# Altium footprint library PCB_CONNECTORS.PcbLib: 676 footprints (part 18 of 43)
Each footprint in its own frame and in the unit in brackets; x right, y up, seen from the top. Pads: shape width x height; smd on the part's side, far side on the other; paste and mask are expansions set on the pad; w line width, h text height; cw(c..) or ccw(c..) is an arc to the next point about the centre after c.
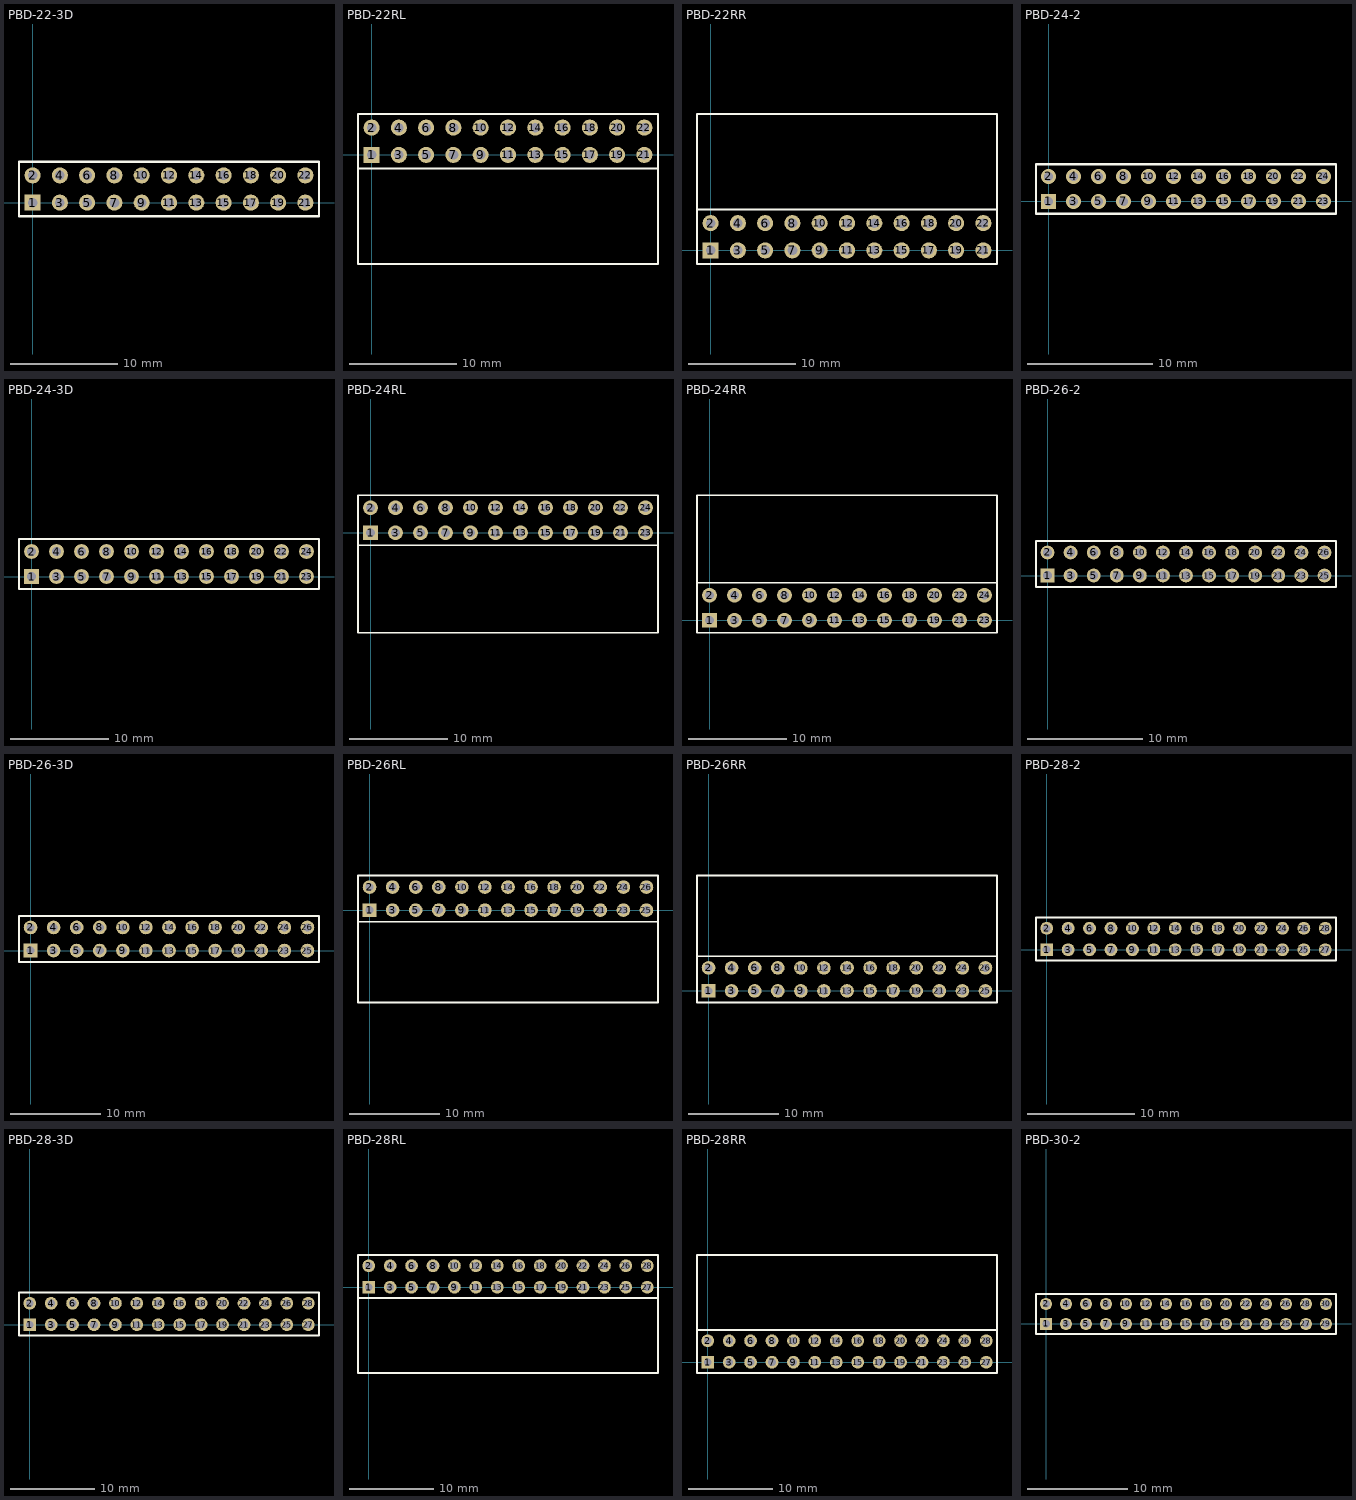
[diagram p17: the footprints below, top view; thin cyan lines are the x and y axes]

## PBD-22-3D [mm] "Connector; Header; 11x2 Position"
height 8
pads (22):
  rect 1.5x1.5 hole 0.9: 1(0,0)
  round 1.5 hole 0.9: 2(0,2.54) 3(2.54,0) 4(2.54,2.54) 5(5.08,0) 6(5.08,2.54) 7(7.62,0) 8(7.62,2.54) 9(10.16,0) 10(10.16,2.54) 11(12.7,0) 12(12.7,2.54) 13(15.24,0) 14(15.24,2.54) 15(17.78,0) 16(17.78,2.54) 17(20.32,0) 18(20.32,2.54) 19(22.86,0) 20(22.86,2.54) 21(25.4,0) 22(25.4,2.54)
Top Overlay:
  lines w0.2: -1.27,-1.27 -1.27,3.81 26.67,3.81 26.67,-1.27 -1.27,-1.27
3D body "PBD-2.stp": height 8.5, standoff -3.15, extent 16.51,-1.27 19.05,3.81
3D body "PBD-2.stp": height 8.5, standoff -3.15, extent 13.97,-1.27 16.51,3.81
3D body "PBD-2.stp": height 8.5, standoff -3.15, extent 19.05,-1.27 21.59,3.81
3D body "PBD-2.stp": height 8.5, standoff -3.15, extent 8.89,-1.27 11.43,3.81
3D body "PBD-2.stp": height 8.5, standoff -3.15, extent 6.35,-1.27 8.89,3.81
3D body "PBD-2.stp": height 8.5, standoff -3.15, extent 11.43,-1.27 13.97,3.81
3D body "PBD-2.stp": height 8.5, standoff -3.15, extent 1.27,-1.27 3.81,3.81
3D body "PBD-2.stp": height 8.5, standoff -3.15, extent -1.27,-1.27 1.27,3.81
3D body "PBD-2.stp": height 8.5, standoff -3.15, extent 3.81,-1.27 6.35,3.81
3D body "PBD-2.stp": height 8.5, standoff -3.15, extent 21.59,-1.27 24.13,3.81
3D body "PBD-2.stp": height 8.5, standoff -3.15, extent 24.13,-1.27 26.67,3.81

## PBD-22RL [mm] "Connector; Header; 11x2 Position"
height 5
pads (22):
  rect 1.5x1.5 hole 0.9: 1(0,0)
  round 1.5 hole 0.9: 2(0,2.54) 3(2.54,0) 4(2.54,2.54) 5(5.08,0) 6(5.08,2.54) 7(7.62,0) 8(7.62,2.54) 9(10.16,0) 10(10.16,2.54) 11(12.7,0) 12(12.7,2.54) 13(15.24,0) 14(15.24,2.54) 15(17.78,0) 16(17.78,2.54) 17(20.32,0) 18(20.32,2.54) 19(22.86,0) 20(22.86,2.54) 21(25.4,0) 22(25.4,2.54)
Top Overlay:
  lines w0.2: -1.27,-1.27 -1.27,-10.16 26.67,-10.16 26.67,-1.27 ; -1.27,-1.27 26.67,-1.27 ; -1.27,-1.27 -1.27,3.81 26.67,3.81 26.67,-1.27
3D body "PBD-22R.step": height 5, standoff -3, extent -1.27,-10.16 26.67,2.84

## PBD-22RR [mm] "Connector; Header; 11x2 Position"
height 5
pads (22):
  rect 1.5x1.5 hole 0.9: 1(0,0)
  round 1.5 hole 0.9: 2(0,2.54) 3(2.54,0) 4(2.54,2.54) 5(5.08,0) 6(5.08,2.54) 7(7.62,0) 8(7.62,2.54) 9(10.16,0) 10(10.16,2.54) 11(12.7,0) 12(12.7,2.54) 13(15.24,0) 14(15.24,2.54) 15(17.78,0) 16(17.78,2.54) 17(20.32,0) 18(20.32,2.54) 19(22.86,0) 20(22.86,2.54) 21(25.4,0) 22(25.4,2.54)
Top Overlay:
  lines w0.2: -1.27,3.81 -1.27,12.7 26.67,12.7 26.67,3.81 ; -1.27,3.81 26.67,3.81 ; -1.27,3.81 -1.27,-1.27 26.67,-1.27 26.67,3.81
3D body "PBD-22R.step": height 5, standoff -3, extent -1.27,-0.3 26.67,12.7

## PBD-24-2 [mm] "Connector; Header; 12x2 Position"
height 4.5
pads (24):
  rect 1.2x1.2 hole 0.75: 1(0,0)
  round 1.2 hole 0.75: 2(0,2) 3(2,0) 4(2,2) 5(4,0) 6(4,2) 7(6,0) 8(6,2) 9(8,0) 10(8,2) 11(10,0) 12(10,2) 13(12,0) 14(12,2) 15(14,0) 16(14,2) 17(16,0) 18(16,2) 19(18,0) 20(18,2) 21(20,0) 22(20,2) 23(22,0) 24(22,2)
Top Overlay:
  lines w0.2: -1,-1 23,-1 23,3 -1,3 -1,-1
3D body "PBD2mm.stp": height 4.5, standoff -2.7, extent 21,-1 23,3
3D body "PBD2mm.stp": height 4.5, standoff -2.7, extent 19,-1 21,3
3D body "PBD2mm.stp": height 4.5, standoff -2.7, extent 17,-1 19,3
3D body "PBD2mm.stp": height 4.5, standoff -2.7, extent 15,-1 17,3
3D body "PBD2mm.stp": height 4.5, standoff -2.7, extent 13,-1 15,3
3D body "PBD2mm.stp": height 4.5, standoff -2.7, extent 11,-1 13,3
3D body "PBD2mm.stp": height 4.5, standoff -2.7, extent 9,-1 11,3
3D body "PBD2mm.stp": height 4.5, standoff -2.7, extent 7,-1 9,3
3D body "PBD2mm.stp": height 4.5, standoff -2.7, extent 5,-1 7,3
3D body "PBD2mm.stp": height 4.5, standoff -2.7, extent 3,-1 5,3
3D body "PBD2mm.stp": height 4.5, standoff -2.7, extent 1,-1 3,3
3D body "PBD2mm.stp": height 4.5, standoff -2.7, extent -1,-1 1,3

## PBD-24-3D [mm] "Connector; Header; 12x2 Position"
height 8
pads (24):
  rect 1.5x1.5 hole 0.9: 1(0,0)
  round 1.5 hole 0.9: 2(0,2.54) 3(2.54,0) 4(2.54,2.54) 5(5.08,0) 6(5.08,2.54) 7(7.62,0) 8(7.62,2.54) 9(10.16,0) 10(10.16,2.54) 11(12.7,0) 12(12.7,2.54) 13(15.24,0) 14(15.24,2.54) 15(17.78,0) 16(17.78,2.54) 17(20.32,0) 18(20.32,2.54) 19(22.86,0) 20(22.86,2.54) 21(25.4,0) 22(25.4,2.54) 23(27.94,0) 24(27.94,2.54)
Top Overlay:
  lines w0.2: -1.27,-1.27 -1.27,3.81 29.21,3.81 29.21,-1.27 -1.27,-1.27
3D body "PBD-2.stp": height 8.5, standoff -3.15, extent 3.81,-1.27 6.35,3.81
3D body "PBD-2.stp": height 8.5, standoff -3.15, extent -1.27,-1.27 1.27,3.81
3D body "PBD-2.stp": height 8.5, standoff -3.15, extent 1.27,-1.27 3.81,3.81
3D body "PBD-2.stp": height 8.5, standoff -3.15, extent 11.43,-1.27 13.97,3.81
3D body "PBD-2.stp": height 8.5, standoff -3.15, extent 6.35,-1.27 8.89,3.81
3D body "PBD-2.stp": height 8.5, standoff -3.15, extent 8.89,-1.27 11.43,3.81
3D body "PBD-2.stp": height 8.5, standoff -3.15, extent 19.05,-1.27 21.59,3.81
3D body "PBD-2.stp": height 8.5, standoff -3.15, extent 13.97,-1.27 16.51,3.81
3D body "PBD-2.stp": height 8.5, standoff -3.15, extent 16.51,-1.27 19.05,3.81
3D body "PBD-2.stp": height 8.5, standoff -3.15, extent 26.67,-1.27 29.21,3.81
3D body "PBD-2.stp": height 8.5, standoff -3.15, extent 21.59,-1.27 24.13,3.81
3D body "PBD-2.stp": height 8.5, standoff -3.15, extent 24.13,-1.27 26.67,3.81

## PBD-24RL [mm] "Connector; Header; 12x2 Position"
height 5
pads (24):
  rect 1.5x1.5 hole 0.9: 1(0,0)
  round 1.5 hole 0.9: 2(0,2.54) 3(2.54,0) 4(2.54,2.54) 5(5.08,0) 6(5.08,2.54) 7(7.62,0) 8(7.62,2.54) 9(10.16,0) 10(10.16,2.54) 11(12.7,0) 12(12.7,2.54) 13(15.24,0) 14(15.24,2.54) 15(17.78,0) 16(17.78,2.54) 17(20.32,0) 18(20.32,2.54) 19(22.86,0) 20(22.86,2.54) 21(25.4,0) 22(25.4,2.54) 23(27.94,0) 24(27.94,2.54)
Top Overlay:
  lines w0.2: -1.27,-1.27 29.21,-1.27 ; -1.27,-1.27 -1.27,3.81 29.21,3.81 29.21,-1.27 ; -1.27,-1.27 -1.27,-10.16 29.21,-10.16 29.21,-1.27
3D body "PBD-24R.step": height 5, standoff -3, extent -1.27,-10.16 29.21,2.84

## PBD-24RR [mm] "Connector; Header; 12x2 Position"
height 5
pads (24):
  rect 1.5x1.5 hole 0.9: 1(0,0)
  round 1.5 hole 0.9: 2(0,2.54) 3(2.54,0) 4(2.54,2.54) 5(5.08,0) 6(5.08,2.54) 7(7.62,0) 8(7.62,2.54) 9(10.16,0) 10(10.16,2.54) 11(12.7,0) 12(12.7,2.54) 13(15.24,0) 14(15.24,2.54) 15(17.78,0) 16(17.78,2.54) 17(20.32,0) 18(20.32,2.54) 19(22.86,0) 20(22.86,2.54) 21(25.4,0) 22(25.4,2.54) 23(27.94,0) 24(27.94,2.54)
Top Overlay:
  lines w0.2: -1.27,3.81 29.21,3.81 ; -1.27,3.81 -1.27,-1.27 29.21,-1.27 29.21,3.81 ; -1.27,3.81 -1.27,12.7 29.21,12.7 29.21,3.81
3D body "PBD-24R.step": height 5, standoff -3, extent -1.27,-0.3 29.21,12.7

## PBD-26-2 [mm] "Connector; Header; 13x2 Position"
height 4.5
pads (26):
  rect 1.2x1.2 hole 0.75: 1(0,0)
  round 1.2 hole 0.75: 2(0,2) 3(2,0) 4(2,2) 5(4,0) 6(4,2) 7(6,0) 8(6,2) 9(8,0) 10(8,2) 11(10,0) 12(10,2) 13(12,0) 14(12,2) 15(14,0) 16(14,2) 17(16,0) 18(16,2) 19(18,0) 20(18,2) 21(20,0) 22(20,2) 23(22,0) 24(22,2) 25(24,0) 26(24,2)
Top Overlay:
  lines w0.2: -1,-1 25,-1 25,3 -1,3 -1,-1
3D body "PBD2mm.stp": height 4.5, standoff -2.7, extent 23,-1 25,3
3D body "PBD2mm.stp": height 4.5, standoff -2.7, extent 21,-1 23,3
3D body "PBD2mm.stp": height 4.5, standoff -2.7, extent 19,-1 21,3
3D body "PBD2mm.stp": height 4.5, standoff -2.7, extent 17,-1 19,3
3D body "PBD2mm.stp": height 4.5, standoff -2.7, extent 15,-1 17,3
3D body "PBD2mm.stp": height 4.5, standoff -2.7, extent 13,-1 15,3
3D body "PBD2mm.stp": height 4.5, standoff -2.7, extent 11,-1 13,3
3D body "PBD2mm.stp": height 4.5, standoff -2.7, extent 9,-1 11,3
3D body "PBD2mm.stp": height 4.5, standoff -2.7, extent 7,-1 9,3
3D body "PBD2mm.stp": height 4.5, standoff -2.7, extent 5,-1 7,3
3D body "PBD2mm.stp": height 4.5, standoff -2.7, extent 3,-1 5,3
3D body "PBD2mm.stp": height 4.5, standoff -2.7, extent 1,-1 3,3
3D body "PBD2mm.stp": height 4.5, standoff -2.7, extent -1,-1 1,3

## PBD-26-3D [mm] "Connector; Header; 13x2 Position"
height 8
pads (26):
  rect 1.5x1.5 hole 0.9: 1(0,0)
  round 1.5 hole 0.9: 2(0,2.54) 3(2.54,0) 4(2.54,2.54) 5(5.08,0) 6(5.08,2.54) 7(7.62,0) 8(7.62,2.54) 9(10.16,0) 10(10.16,2.54) 11(12.7,0) 12(12.7,2.54) 13(15.24,0) 14(15.24,2.54) 15(17.78,0) 16(17.78,2.54) 17(20.32,0) 18(20.32,2.54) 19(22.86,0) 20(22.86,2.54) 21(25.4,0) 22(25.4,2.54) 23(27.94,0) 24(27.94,2.54) 25(30.48,0) 26(30.48,2.54)
Top Overlay:
  lines w0.2: -1.27,-1.27 -1.27,3.81 31.75,3.81 31.75,-1.27 -1.27,-1.27
3D body "PBD-2.stp": height 8.5, standoff -3.15, extent 24.13,-1.27 26.67,3.81
3D body "PBD-2.stp": height 8.5, standoff -3.15, extent 21.59,-1.27 24.13,3.81
3D body "PBD-2.stp": height 8.5, standoff -3.15, extent 26.67,-1.27 29.21,3.81
3D body "PBD-2.stp": height 8.5, standoff -3.15, extent 16.51,-1.27 19.05,3.81
3D body "PBD-2.stp": height 8.5, standoff -3.15, extent 13.97,-1.27 16.51,3.81
3D body "PBD-2.stp": height 8.5, standoff -3.15, extent 19.05,-1.27 21.59,3.81
3D body "PBD-2.stp": height 8.5, standoff -3.15, extent 8.89,-1.27 11.43,3.81
3D body "PBD-2.stp": height 8.5, standoff -3.15, extent 6.35,-1.27 8.89,3.81
3D body "PBD-2.stp": height 8.5, standoff -3.15, extent 11.43,-1.27 13.97,3.81
3D body "PBD-2.stp": height 8.5, standoff -3.15, extent 1.27,-1.27 3.81,3.81
3D body "PBD-2.stp": height 8.5, standoff -3.15, extent -1.27,-1.27 1.27,3.81
3D body "PBD-2.stp": height 8.5, standoff -3.15, extent 3.81,-1.27 6.35,3.81
3D body "PBD-2.stp": height 8.5, standoff -3.15, extent 29.21,-1.27 31.75,3.81

## PBD-26RL [mm] "Connector; Header; 13x2 Position"
height 5
pads (26):
  rect 1.5x1.5 hole 0.9: 1(0,0)
  round 1.5 hole 0.9: 2(0,2.54) 3(2.54,0) 4(2.54,2.54) 5(5.08,0) 6(5.08,2.54) 7(7.62,0) 8(7.62,2.54) 9(10.16,0) 10(10.16,2.54) 11(12.7,0) 12(12.7,2.54) 13(15.24,0) 14(15.24,2.54) 15(17.78,0) 16(17.78,2.54) 17(20.32,0) 18(20.32,2.54) 19(22.86,0) 20(22.86,2.54) 21(25.4,0) 22(25.4,2.54) 23(27.94,0) 24(27.94,2.54) 25(30.48,0) 26(30.48,2.54)
Top Overlay:
  lines w0.2: -1.27,-1.27 -1.27,-10.16 31.75,-10.16 31.75,-1.27 ; -1.27,-1.27 -1.27,3.81 31.75,3.81 31.75,-1.27 ; -1.27,-1.27 31.75,-1.27
3D body "PBD-26R.step": height 5, standoff -3, extent -1.27,-10.16 31.75,2.84

## PBD-26RR [mm] "Connector; Header; 13x2 Position"
height 5
pads (26):
  rect 1.5x1.5 hole 0.9: 1(0,0)
  round 1.5 hole 0.9: 2(0,2.54) 3(2.54,0) 4(2.54,2.54) 5(5.08,0) 6(5.08,2.54) 7(7.62,0) 8(7.62,2.54) 9(10.16,0) 10(10.16,2.54) 11(12.7,0) 12(12.7,2.54) 13(15.24,0) 14(15.24,2.54) 15(17.78,0) 16(17.78,2.54) 17(20.32,0) 18(20.32,2.54) 19(22.86,0) 20(22.86,2.54) 21(25.4,0) 22(25.4,2.54) 23(27.94,0) 24(27.94,2.54) 25(30.48,0) 26(30.48,2.54)
Top Overlay:
  lines w0.2: -1.27,3.81 31.75,3.81 ; -1.27,3.81 -1.27,-1.27 31.75,-1.27 31.75,3.81 ; -1.27,3.81 -1.27,12.7 31.75,12.7 31.75,3.81
3D body "PBD-26R.step": height 5, standoff -3, extent -1.27,-0.3 31.75,12.7

## PBD-28-2 [mm] "Connector; Header; 14x2 Position"
height 4.5
pads (28):
  rect 1.2x1.2 hole 0.75: 1(0,0)
  round 1.2 hole 0.75: 2(0,2) 3(2,0) 4(2,2) 5(4,0) 6(4,2) 7(6,0) 8(6,2) 9(8,0) 10(8,2) 11(10,0) 12(10,2) 13(12,0) 14(12,2) 15(14,0) 16(14,2) 17(16,0) 18(16,2) 19(18,0) 20(18,2) 21(20,0) 22(20,2) 23(22,0) 24(22,2) 25(24,0) 26(24,2) 27(26,0) 28(26,2)
Top Overlay:
  lines w0.2: -1,-1 -1,3 27,3 27,-1 -1,-1
3D body "PBD2mm.stp": height 4.5, standoff -2.7, extent -1,-1 1,3
3D body "PBD2mm.stp": height 4.5, standoff -2.7, extent 1,-1 3,3
3D body "PBD2mm.stp": height 4.5, standoff -2.7, extent 3,-1 5,3
3D body "PBD2mm.stp": height 4.5, standoff -2.7, extent 5,-1 7,3
3D body "PBD2mm.stp": height 4.5, standoff -2.7, extent 7,-1 9,3
3D body "PBD2mm.stp": height 4.5, standoff -2.7, extent 9,-1 11,3
3D body "PBD2mm.stp": height 4.5, standoff -2.7, extent 11,-1 13,3
3D body "PBD2mm.stp": height 4.5, standoff -2.7, extent 13,-1 15,3
3D body "PBD2mm.stp": height 4.5, standoff -2.7, extent 15,-1 17,3
3D body "PBD2mm.stp": height 4.5, standoff -2.7, extent 17,-1 19,3
3D body "PBD2mm.stp": height 4.5, standoff -2.7, extent 19,-1 21,3
3D body "PBD2mm.stp": height 4.5, standoff -2.7, extent 21,-1 23,3
3D body "PBD2mm.stp": height 4.5, standoff -2.7, extent 23,-1 25,3
3D body "PBD2mm.stp": height 4.5, standoff -2.7, extent 25,-1 27,3

## PBD-28-3D [mm] "Connector; Header; 14x2 Position"
height 8
pads (28):
  rect 1.5x1.5 hole 0.9: 1(0,0)
  round 1.5 hole 0.9: 2(0,2.54) 3(2.54,0) 4(2.54,2.54) 5(5.08,0) 6(5.08,2.54) 7(7.62,0) 8(7.62,2.54) 9(10.16,0) 10(10.16,2.54) 11(12.7,0) 12(12.7,2.54) 13(15.24,0) 14(15.24,2.54) 15(17.78,0) 16(17.78,2.54) 17(20.32,0) 18(20.32,2.54) 19(22.86,0) 20(22.86,2.54) 21(25.4,0) 22(25.4,2.54) 23(27.94,0) 24(27.94,2.54) 25(30.48,0) 26(30.48,2.54) 27(33.02,0) 28(33.02,2.54)
Top Overlay:
  lines w0.2: -1.27,-1.27 34.29,-1.27 34.29,3.81 -1.27,3.81 -1.27,-1.27
3D body "PBD-2.stp": height 8.5, standoff -3.15, extent 31.75,-1.27 34.29,3.81
3D body "PBD-2.stp": height 8.5, standoff -3.15, extent 29.21,-1.27 31.75,3.81
3D body "PBD-2.stp": height 8.5, standoff -3.15, extent 3.81,-1.27 6.35,3.81
3D body "PBD-2.stp": height 8.5, standoff -3.15, extent -1.27,-1.27 1.27,3.81
3D body "PBD-2.stp": height 8.5, standoff -3.15, extent 1.27,-1.27 3.81,3.81
3D body "PBD-2.stp": height 8.5, standoff -3.15, extent 11.43,-1.27 13.97,3.81
3D body "PBD-2.stp": height 8.5, standoff -3.15, extent 6.35,-1.27 8.89,3.81
3D body "PBD-2.stp": height 8.5, standoff -3.15, extent 8.89,-1.27 11.43,3.81
3D body "PBD-2.stp": height 8.5, standoff -3.15, extent 19.05,-1.27 21.59,3.81
3D body "PBD-2.stp": height 8.5, standoff -3.15, extent 13.97,-1.27 16.51,3.81
3D body "PBD-2.stp": height 8.5, standoff -3.15, extent 16.51,-1.27 19.05,3.81
3D body "PBD-2.stp": height 8.5, standoff -3.15, extent 26.67,-1.27 29.21,3.81
3D body "PBD-2.stp": height 8.5, standoff -3.15, extent 21.59,-1.27 24.13,3.81
3D body "PBD-2.stp": height 8.5, standoff -3.15, extent 24.13,-1.27 26.67,3.81

## PBD-28RL [mm] "Connector; Header; 14x2 Position"
height 5
pads (28):
  rect 1.5x1.5 hole 0.9: 1(0,0)
  round 1.5 hole 0.9: 2(0,2.54) 3(2.54,0) 4(2.54,2.54) 5(5.08,0) 6(5.08,2.54) 7(7.62,0) 8(7.62,2.54) 9(10.16,0) 10(10.16,2.54) 11(12.7,0) 12(12.7,2.54) 13(15.24,0) 14(15.24,2.54) 15(17.78,0) 16(17.78,2.54) 17(20.32,0) 18(20.32,2.54) 19(22.86,0) 20(22.86,2.54) 21(25.4,0) 22(25.4,2.54) 23(27.94,0) 24(27.94,2.54) 25(30.48,0) 26(30.48,2.54) 27(33.02,0) 28(33.02,2.54)
Top Overlay:
  lines w0.2: -1.27,-1.27 34.29,-1.27 ; -1.27,-1.27 -1.27,3.81 34.29,3.81 34.29,-1.27 ; -1.27,-1.27 -1.27,-10.16 34.29,-10.16 34.29,-1.27
3D body "PBD-28R.step": height 5, standoff -3, extent -1.27,-10.16 34.29,2.84

## PBD-28RR [mm] "Connector; Header; 14x2 Position"
height 5
pads (28):
  rect 1.5x1.5 hole 0.9: 1(0,0)
  round 1.5 hole 0.9: 2(0,2.54) 3(2.54,0) 4(2.54,2.54) 5(5.08,0) 6(5.08,2.54) 7(7.62,0) 8(7.62,2.54) 9(10.16,0) 10(10.16,2.54) 11(12.7,0) 12(12.7,2.54) 13(15.24,0) 14(15.24,2.54) 15(17.78,0) 16(17.78,2.54) 17(20.32,0) 18(20.32,2.54) 19(22.86,0) 20(22.86,2.54) 21(25.4,0) 22(25.4,2.54) 23(27.94,0) 24(27.94,2.54) 25(30.48,0) 26(30.48,2.54) 27(33.02,0) 28(33.02,2.54)
Top Overlay:
  lines w0.2: -1.27,3.81 -1.27,12.7 34.29,12.7 34.29,3.81 ; -1.27,3.81 -1.27,-1.27 34.29,-1.27 34.29,3.81 ; -1.27,3.81 34.29,3.81
3D body "PBD-28R.step": height 5, standoff -3, extent -1.27,-0.3 34.29,12.7

## PBD-30-2 [mm] "Connector; Header; 15x2 Position"
height 4.5
pads (30):
  rect 1.2x1.2 hole 0.75: 1(0,0)
  round 1.2 hole 0.75: 2(0,2) 3(2,0) 4(2,2) 5(4,0) 6(4,2) 7(6,0) 8(6,2) 9(8,0) 10(8,2) 11(10,0) 12(10,2) 13(12,0) 14(12,2) 15(14,0) 16(14,2) 17(16,0) 18(16,2) 19(18,0) 20(18,2) 21(20,0) 22(20,2) 23(22,0) 24(22,2) 25(24,0) 26(24,2) 27(26,0) 28(26,2) 29(28,0) 30(28,2)
Top Overlay:
  lines w0.2: -1,-1 -1,3 29,3 29,-1 -1,-1
3D body "PBD2mm.stp": height 4.5, standoff -2.7, extent -1,-1 1,3
3D body "PBD2mm.stp": height 4.5, standoff -2.7, extent 1,-1 3,3
3D body "PBD2mm.stp": height 4.5, standoff -2.7, extent 3,-1 5,3
3D body "PBD2mm.stp": height 4.5, standoff -2.7, extent 5,-1 7,3
3D body "PBD2mm.stp": height 4.5, standoff -2.7, extent 7,-1 9,3
3D body "PBD2mm.stp": height 4.5, standoff -2.7, extent 9,-1 11,3
3D body "PBD2mm.stp": height 4.5, standoff -2.7, extent 11,-1 13,3
3D body "PBD2mm.stp": height 4.5, standoff -2.7, extent 13,-1 15,3
3D body "PBD2mm.stp": height 4.5, standoff -2.7, extent 15,-1 17,3
3D body "PBD2mm.stp": height 4.5, standoff -2.7, extent 17,-1 19,3
3D body "PBD2mm.stp": height 4.5, standoff -2.7, extent 19,-1 21,3
3D body "PBD2mm.stp": height 4.5, standoff -2.7, extent 21,-1 23,3
3D body "PBD2mm.stp": height 4.5, standoff -2.7, extent 23,-1 25,3
3D body "PBD2mm.stp": height 4.5, standoff -2.7, extent 25,-1 27,3
3D body "PBD2mm.stp": height 4.5, standoff -2.7, extent 27,-1 29,3